# Altium schematic symbol library MCU_Microchip_ATmega.SchLib: 440 symbols (part 9 of 9) (continued)
## ATxmega192C3-M (continued)

## ATxmega192D3-A
designator *  value ATxmega192D3-A
ki_keywords: AVR 8/16bit Microcontroller XMegaAVR; ki_description: 32MHz, 192kB Flash, 8kB Boot, 16kB SRAM, 2kB EEPROM, JTAG, TQFP-64; ki_fp_filters: TQFP*14x14mm*P0.8mm*; Footprint: Package_QFP:TQFP-64_14x14mm_P0.8mm; Supplier: http://ww1.microchip.com/downloads/en/DeviceDoc/Atmel-8134-8-16-bit-Atmel-XMEGA-D3-Microcontroller_Datasheet.pdf
footprint TQFP-64_14x14mm_P0.8mm
pins: 1 PA3 (io), 2 PA4 (io), 3 PA5 (io), 4 PA6 (io), 5 PA7 (io), 6 AREFB/PB0 (io), 7 PB1 (io), 8 PB2 (io), 9 PB3 (io), 10 PB4 (io), 11 PB5 (io), 12 PB6 (io), 13 PB7 (io), 14 GND (power), 15 VCC (power), 16 PC0 (io), 17 PC1 (io), 18 PC2 (io), 19 PC3 (io), 20 PC4 (io), 21 PC5 (io), 22 PC6 (io), 23 PC7 (io), 24 GND hidden, 25 VCC hidden, 26 PD0 (io), 27 PD1 (io), 28 PD2 (io), 29 PD3 (io), 30 PD4 (io), 31 PD5 (io), 32 PD6 (io), 33 PD7 (io), 34 GND hidden, 35 VCC hidden, 36 PE0 (io), 37 PE1 (io), 38 PE2 (io), 39 PE3 (io), 40 PE4 (io), 41 PE5 (io), 42 PE6 (io), 43 PE7 (io), 44 GND hidden, 45 VCC hidden, 46 PF0 (io), 47 PF1 (io), 48 PF2 (io), 49 PF3 (io), 50 PF4 (io), 51 PF5 (io), 52 GND hidden, 53 VCC hidden, 54 PF6 (io), 55 PF7 (io), 56 PDI_DATA (io), 57 ~{{RESET}/PDI_CLK} (in), 58 PR0/XTAL2 (io), 59 PR1/XTAL1 (io), 60 GND hidden, 61 AVCC (power), 62 AREFA/PA0 (io), 63 PA1 (io), 64 PA2 (io)

## ATxmega192D3-M
designator *  value ATxmega192D3-M
ki_keywords: AVR 8/16bit Microcontroller XMegaAVR; ki_description: 32MHz, 192kB Flash, 8kB Boot, 16kB SRAM, 2kB EEPROM, JTAG, QFN-64; ki_fp_filters: QFN*1EP*9x9mm*P0.5mm*; Footprint: Package_DFN_QFN:QFN-64-1EP_9x9mm_P0.5mm_EP7.65x7.65mm; Supplier: http://ww1.microchip.com/downloads/en/DeviceDoc/Atmel-8134-8-16-bit-Atmel-XMEGA-D3-Microcontroller_Datasheet.pdf
footprint QFN-64-1EP_9x9mm_P0.5mm_EP7.65x7.65mm
pins: 1 PA3 (io), 2 PA4 (io), 3 PA5 (io), 4 PA6 (io), 5 PA7 (io), 6 AREFB/PB0 (io), 7 PB1 (io), 8 PB2 (io), 9 PB3 (io), 10 PB4 (io), 11 PB5 (io), 12 PB6 (io), 13 PB7 (io), 14 GND (power), 15 VCC (power), 16 PC0 (io), 17 PC1 (io), 18 PC2 (io), 19 PC3 (io), 20 PC4 (io), 21 PC5 (io), 22 PC6 (io), 23 PC7 (io), 24 GND hidden, 25 VCC hidden, 26 PD0 (io), 27 PD1 (io), 28 PD2 (io), 29 PD3 (io), 30 PD4 (io), 31 PD5 (io), 32 PD6 (io), 33 PD7 (io), 34 GND hidden, 35 VCC hidden, 36 PE0 (io), 37 PE1 (io), 38 PE2 (io), 39 PE3 (io), 40 PE4 (io), 41 PE5 (io), 42 PE6 (io), 43 PE7 (io), 44 GND hidden, 45 VCC hidden, 46 PF0 (io), 47 PF1 (io), 48 PF2 (io), 49 PF3 (io), 50 PF4 (io), 51 PF5 (io), 52 GND hidden, 53 VCC hidden, 54 PF6 (io), 55 PF7 (io), 56 PDI_DATA (io), 57 ~{{RESET}/PDI_CLK} (in), 58 PR0/XTAL2 (io), 59 PR1/XTAL1 (io), 60 GND hidden, 61 AVCC (power), 62 AREFA/PA0 (io), 63 PA1 (io), 64 PA2 (io), 65 GND hidden

## ATxmega256A3-A
designator *  value ATxmega256A3-A
ki_keywords: AVR 8/16bit Microcontroller XMegaAVR; ki_description: 32MHz, 256kB Flash, 8kB Boot, 16kB SRAM, 4kB EEPROM, JTAG, TQFP-64; ki_fp_filters: TQFP*14x14mm*P0.8mm*; Footprint: Package_QFP:TQFP-64_14x14mm_P0.8mm; Supplier: http://ww1.microchip.com/downloads/en/DeviceDoc/Atmel-8068-8-and16-bit-AVR-XMEGA-A3-Microcontrollers_Datasheet.pdf
footprint TQFP-64_14x14mm_P0.8mm
pins: 1 PA3 (io), 2 PA4 (io), 3 PA5 (io), 4 PA6 (io), 5 PA7 (io), 6 AREFB/PB0 (io), 7 PB1 (io), 8 PB2 (io), 9 PB3 (io), 10 PB4 (io), 11 PB5 (io), 12 PB6 (io), 13 PB7 (io), 14 GND (power), 15 VCC (power), 16 PC0 (io), 17 PC1 (io), 18 PC2 (io), 19 PC3 (io), 20 PC4 (io), 21 PC5 (io), 22 PC6 (io), 23 PC7 (io), 24 GND hidden, 25 VCC hidden, 26 PD0 (io), 27 PD1 (io), 28 PD2 (io), 29 PD3 (io), 30 PD4 (io), 31 PD5 (io), 32 PD6 (io), 33 PD7 (io), 34 GND hidden, 35 VCC hidden, 36 PE0 (io), 37 PE1 (io), 38 PE2 (io), 39 PE3 (io), 40 PE4 (io), 41 PE5 (io), 42 PE6 (io), 43 PE7 (io), 44 GND hidden, 45 VCC hidden, 46 PF0 (io), 47 PF1 (io), 48 PF2 (io), 49 PF3 (io), 50 PF4 (io), 51 PF5 (io), 52 GND hidden, 53 VCC hidden, 54 PF6 (io), 55 PF7 (io), 56 PDI_DATA (io), 57 ~{{RESET}/PDI_CLK} (in), 58 PR0/XTAL2 (io), 59 PR1/XTAL1 (io), 60 GND hidden, 61 AVCC (power), 62 AREFA/PA0 (io), 63 PA1 (io), 64 PA2 (io)

## ATxmega256A3-M
designator *  value ATxmega256A3-M
ki_keywords: AVR 8/16bit Microcontroller XMegaAVR; ki_description: 32MHz, 256kB Flash, 8kB Boot, 16kB SRAM, 4kB EEPROM, JTAG, QFN-64; ki_fp_filters: QFN*1EP*9x9mm*P0.5mm*; Footprint: Package_DFN_QFN:QFN-64-1EP_9x9mm_P0.5mm_EP7.65x7.65mm; Supplier: http://ww1.microchip.com/downloads/en/DeviceDoc/Atmel-8068-8-and16-bit-AVR-XMEGA-A3-Microcontrollers_Datasheet.pdf
footprint QFN-64-1EP_9x9mm_P0.5mm_EP7.65x7.65mm
pins: 1 PA3 (io), 2 PA4 (io), 3 PA5 (io), 4 PA6 (io), 5 PA7 (io), 6 AREFB/PB0 (io), 7 PB1 (io), 8 PB2 (io), 9 PB3 (io), 10 PB4 (io), 11 PB5 (io), 12 PB6 (io), 13 PB7 (io), 14 GND (power), 15 VCC (power), 16 PC0 (io), 17 PC1 (io), 18 PC2 (io), 19 PC3 (io), 20 PC4 (io), 21 PC5 (io), 22 PC6 (io), 23 PC7 (io), 24 GND hidden, 25 VCC hidden, 26 PD0 (io), 27 PD1 (io), 28 PD2 (io), 29 PD3 (io), 30 PD4 (io), 31 PD5 (io), 32 PD6 (io), 33 PD7 (io), 34 GND hidden, 35 VCC hidden, 36 PE0 (io), 37 PE1 (io), 38 PE2 (io), 39 PE3 (io), 40 PE4 (io), 41 PE5 (io), 42 PE6 (io), 43 PE7 (io), 44 GND hidden, 45 VCC hidden, 46 PF0 (io), 47 PF1 (io), 48 PF2 (io), 49 PF3 (io), 50 PF4 (io), 51 PF5 (io), 52 GND hidden, 53 VCC hidden, 54 PF6 (io), 55 PF7 (io), 56 PDI_DATA (io), 57 ~{{RESET}/PDI_CLK} (in), 58 PR0/XTAL2 (io), 59 PR1/XTAL1 (io), 60 GND hidden, 61 AVCC (power), 62 AREFA/PA0 (io), 63 PA1 (io), 64 PA2 (io), 65 GND hidden

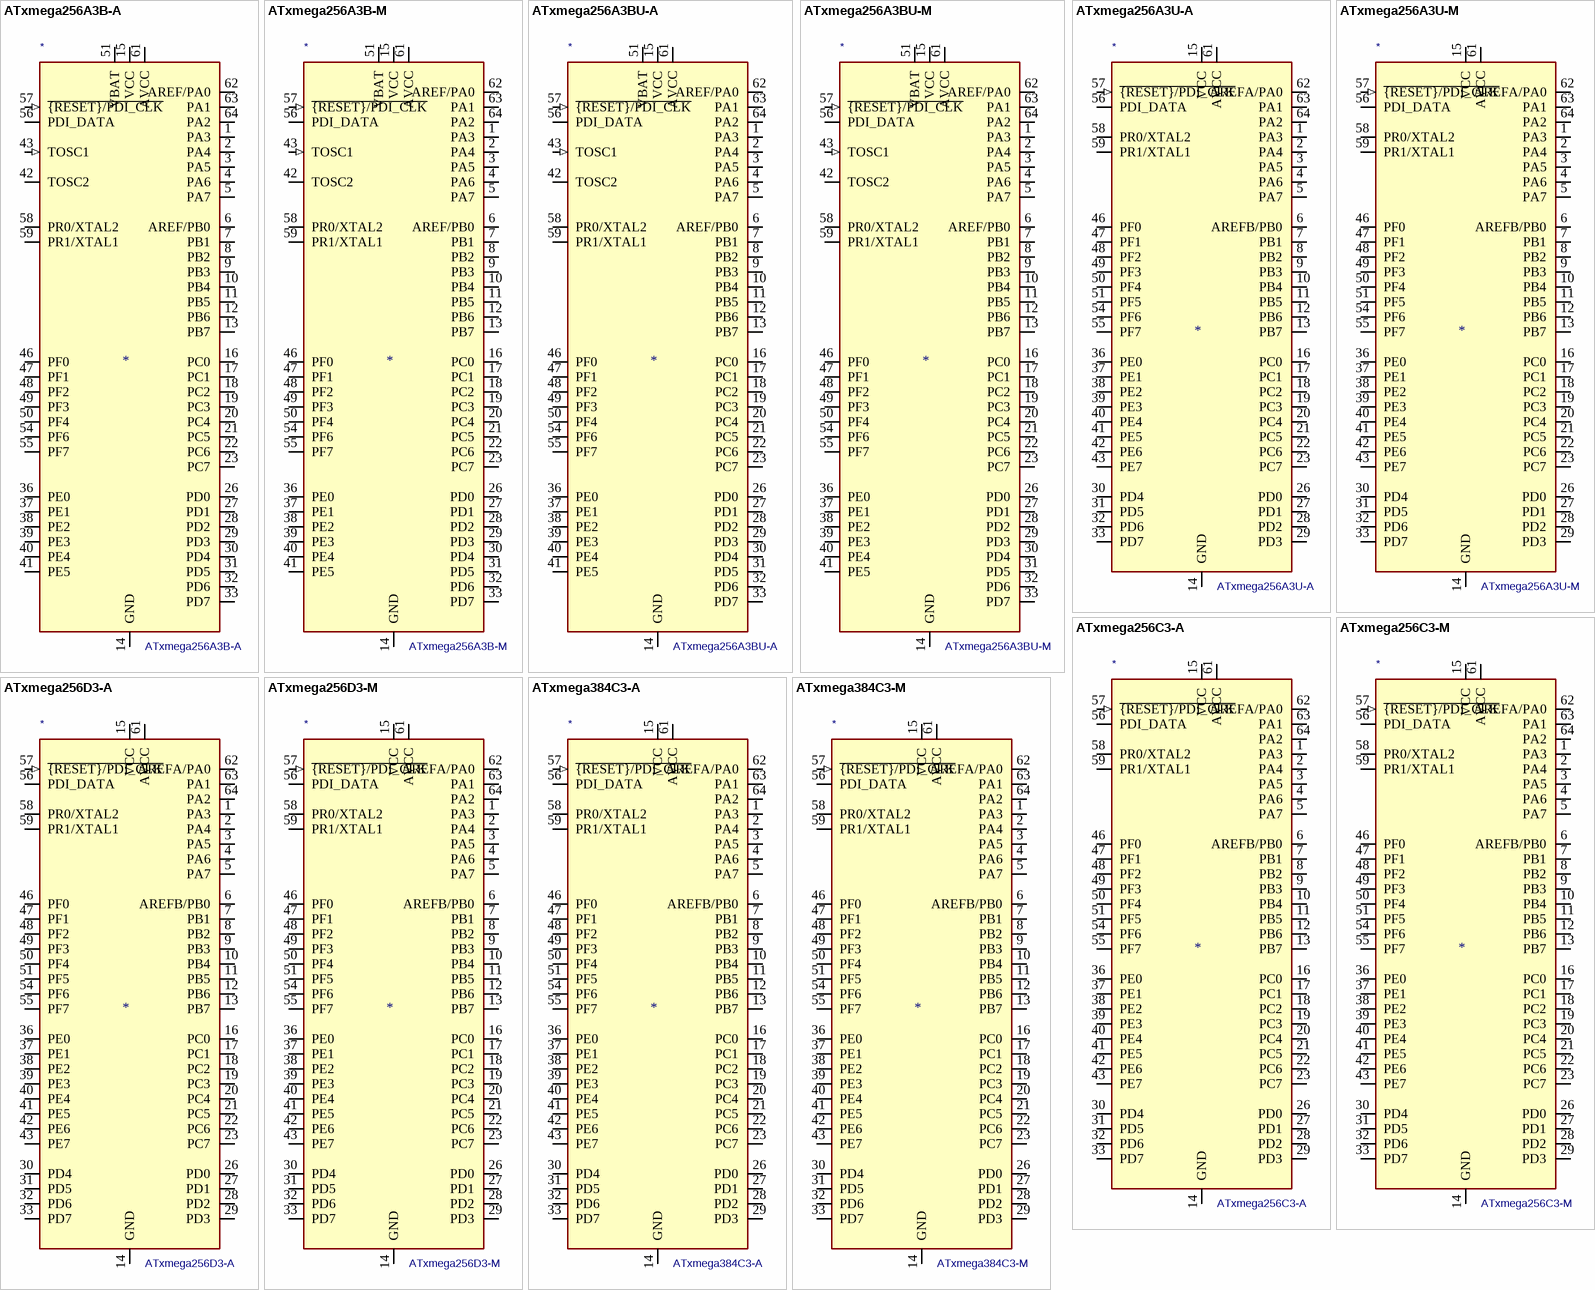
[diagram p39: symbols ATxmega256A3B-A to ATxmega384C3-M]

## ATxmega256A3B-A
designator *  value ATxmega256A3B-A
ki_keywords: AVR 8/16bit Microcontroller XMegaAVR; ki_description: 32MHz, 256kB Flash, 8kB Boot, 16kB SRAM, 4kB EEPROM, JTAG, TQFP-64; ki_fp_filters: TQFP*14x14mm*P0.8mm*; Footprint: Package_QFP:TQFP-64_14x14mm_P0.8mm; Supplier: http://ww1.microchip.com/downloads/en/DeviceDoc/Atmel-8116-8-and-16-bit-AVR-XMEGA-A3B-Microcontroller_Datasheet.pdf
footprint TQFP-64_14x14mm_P0.8mm
pins: 1 PA3 (io), 2 PA4 (io), 3 PA5 (io), 4 PA6 (io), 5 PA7 (io), 6 AREF/PB0 (io), 7 PB1 (io), 8 PB2 (io), 9 PB3 (io), 10 PB4 (io), 11 PB5 (io), 12 PB6 (io), 13 PB7 (io), 14 GND (power), 15 VCC (power), 16 PC0 (io), 17 PC1 (io), 18 PC2 (io), 19 PC3 (io), 20 PC4 (io), 21 PC5 (io), 22 PC6 (io), 23 PC7 (io), 24 GND hidden, 25 VCC hidden, 26 PD0 (io), 27 PD1 (io), 28 PD2 (io), 29 PD3 (io), 30 PD4 (io), 31 PD5 (io), 32 PD6 (io), 33 PD7 (io), 34 GND hidden, 35 VCC hidden, 36 PE0 (io), 37 PE1 (io), 38 PE2 (io), 39 PE3 (io), 40 PE4 (io), 41 PE5 (io), 42 TOSC2, 43 TOSC1 (in), 44 GND hidden, 45 VCC hidden, 46 PF0 (io), 47 PF1 (io), 48 PF2 (io), 49 PF3 (io), 50 PF4 (io), 51 VBAT (power), 52 GND hidden, 53 VCC hidden, 54 PF6 (io), 55 PF7 (io), 56 PDI_DATA (io), 57 ~{{RESET}/PDI_CLK} (in), 58 PR0/XTAL2 (io), 59 PR1/XTAL1 (io), 60 GND hidden, 61 AVCC (power), 62 AREF/PA0 (io), 63 PA1 (io), 64 PA2 (io)

## ATxmega256A3B-M
designator *  value ATxmega256A3B-M
ki_keywords: AVR 8/16bit Microcontroller XMegaAVR; ki_description: 32MHz, 256kB Flash, 8kB Boot, 16kB SRAM, 4kB EEPROM, JTAG, QFN-64; ki_fp_filters: QFN*1EP*9x9mm*P0.5mm*; Footprint: Package_DFN_QFN:QFN-64-1EP_9x9mm_P0.5mm_EP7.65x7.65mm; Supplier: http://ww1.microchip.com/downloads/en/DeviceDoc/Atmel-8116-8-and-16-bit-AVR-XMEGA-A3B-Microcontroller_Datasheet.pdf
footprint QFN-64-1EP_9x9mm_P0.5mm_EP7.65x7.65mm
pins: 1 PA3 (io), 2 PA4 (io), 3 PA5 (io), 4 PA6 (io), 5 PA7 (io), 6 AREF/PB0 (io), 7 PB1 (io), 8 PB2 (io), 9 PB3 (io), 10 PB4 (io), 11 PB5 (io), 12 PB6 (io), 13 PB7 (io), 14 GND (power), 15 VCC (power), 16 PC0 (io), 17 PC1 (io), 18 PC2 (io), 19 PC3 (io), 20 PC4 (io), 21 PC5 (io), 22 PC6 (io), 23 PC7 (io), 24 GND hidden, 25 VCC hidden, 26 PD0 (io), 27 PD1 (io), 28 PD2 (io), 29 PD3 (io), 30 PD4 (io), 31 PD5 (io), 32 PD6 (io), 33 PD7 (io), 34 GND hidden, 35 VCC hidden, 36 PE0 (io), 37 PE1 (io), 38 PE2 (io), 39 PE3 (io), 40 PE4 (io), 41 PE5 (io), 42 TOSC2, 43 TOSC1 (in), 44 GND hidden, 45 VCC hidden, 46 PF0 (io), 47 PF1 (io), 48 PF2 (io), 49 PF3 (io), 50 PF4 (io), 51 VBAT (power), 52 GND hidden, 53 VCC hidden, 54 PF6 (io), 55 PF7 (io), 56 PDI_DATA (io), 57 ~{{RESET}/PDI_CLK} (in), 58 PR0/XTAL2 (io), 59 PR1/XTAL1 (io), 60 GND hidden, 61 AVCC (power), 62 AREF/PA0 (io), 63 PA1 (io), 64 PA2 (io), 65 GND hidden

## ATxmega256A3BU-A
designator *  value ATxmega256A3BU-A
ki_keywords: AVR 8/16bit Microcontroller XMegaAVR; ki_description: 32MHz, 256kB Flash, 8kB Boot, 16kB SRAM, 4kB EEPROM, JTAG, USB, TQFP-64; ki_fp_filters: TQFP*14x14mm*P0.8mm*; Footprint: Package_QFP:TQFP-64_14x14mm_P0.8mm; Supplier: http://ww1.microchip.com/downloads/en/DeviceDoc/Atmel-8362-8-and-16bit-AVR-microcontroller-ATxmega256A3BU_datasheet.pdf
footprint TQFP-64_14x14mm_P0.8mm
pins: 1 PA3 (io), 2 PA4 (io), 3 PA5 (io), 4 PA6 (io), 5 PA7 (io), 6 AREF/PB0 (io), 7 PB1 (io), 8 PB2 (io), 9 PB3 (io), 10 PB4 (io), 11 PB5 (io), 12 PB6 (io), 13 PB7 (io), 14 GND (power), 15 VCC (power), 16 PC0 (io), 17 PC1 (io), 18 PC2 (io), 19 PC3 (io), 20 PC4 (io), 21 PC5 (io), 22 PC6 (io), 23 PC7 (io), 24 GND hidden, 25 VCC hidden, 26 PD0 (io), 27 PD1 (io), 28 PD2 (io), 29 PD3 (io), 30 PD4 (io), 31 PD5 (io), 32 PD6 (io), 33 PD7 (io), 34 GND hidden, 35 VCC hidden, 36 PE0 (io), 37 PE1 (io), 38 PE2 (io), 39 PE3 (io), 40 PE4 (io), 41 PE5 (io), 42 TOSC2, 43 TOSC1 (in), 44 GND hidden, 45 VCC hidden, 46 PF0 (io), 47 PF1 (io), 48 PF2 (io), 49 PF3 (io), 50 PF4 (io), 51 VBAT (power), 52 GND hidden, 53 VCC hidden, 54 PF6 (io), 55 PF7 (io), 56 PDI_DATA (io), 57 ~{{RESET}/PDI_CLK} (in), 58 PR0/XTAL2 (io), 59 PR1/XTAL1 (io), 60 GND hidden, 61 AVCC (power), 62 AREF/PA0 (io), 63 PA1 (io), 64 PA2 (io)

## ATxmega256A3BU-M
designator *  value ATxmega256A3BU-M
ki_keywords: AVR 8/16bit Microcontroller XMegaAVR; ki_description: 32MHz, 256kB Flash, 8kB Boot, 16kB SRAM, 4kB EEPROM, JTAG, USB, QFN-64; ki_fp_filters: QFN*1EP*9x9mm*P0.5mm*; Footprint: Package_DFN_QFN:QFN-64-1EP_9x9mm_P0.5mm_EP7.65x7.65mm; Supplier: http://ww1.microchip.com/downloads/en/DeviceDoc/Atmel-8362-8-and-16bit-AVR-microcontroller-ATxmega256A3BU_datasheet.pdf
footprint QFN-64-1EP_9x9mm_P0.5mm_EP7.65x7.65mm
pins: 1 PA3 (io), 2 PA4 (io), 3 PA5 (io), 4 PA6 (io), 5 PA7 (io), 6 AREF/PB0 (io), 7 PB1 (io), 8 PB2 (io), 9 PB3 (io), 10 PB4 (io), 11 PB5 (io), 12 PB6 (io), 13 PB7 (io), 14 GND (power), 15 VCC (power), 16 PC0 (io), 17 PC1 (io), 18 PC2 (io), 19 PC3 (io), 20 PC4 (io), 21 PC5 (io), 22 PC6 (io), 23 PC7 (io), 24 GND hidden, 25 VCC hidden, 26 PD0 (io), 27 PD1 (io), 28 PD2 (io), 29 PD3 (io), 30 PD4 (io), 31 PD5 (io), 32 PD6 (io), 33 PD7 (io), 34 GND hidden, 35 VCC hidden, 36 PE0 (io), 37 PE1 (io), 38 PE2 (io), 39 PE3 (io), 40 PE4 (io), 41 PE5 (io), 42 TOSC2, 43 TOSC1 (in), 44 GND hidden, 45 VCC hidden, 46 PF0 (io), 47 PF1 (io), 48 PF2 (io), 49 PF3 (io), 50 PF4 (io), 51 VBAT (power), 52 GND hidden, 53 VCC hidden, 54 PF6 (io), 55 PF7 (io), 56 PDI_DATA (io), 57 ~{{RESET}/PDI_CLK} (in), 58 PR0/XTAL2 (io), 59 PR1/XTAL1 (io), 60 GND hidden, 61 AVCC (power), 62 AREF/PA0 (io), 63 PA1 (io), 64 PA2 (io), 65 GND hidden

## ATxmega256A3U-A
designator *  value ATxmega256A3U-A
ki_keywords: AVR 8/16bit Microcontroller XMegaAVR; ki_description: 32MHz, 256kB Flash, 8kB Boot, 16kB SRAM, 4kB EEPROM, JTAG, USB, TQFP-64; ki_fp_filters: TQFP*14x14mm*P0.8mm*; Footprint: Package_QFP:TQFP-64_14x14mm_P0.8mm; Supplier: http://ww1.microchip.com/downloads/en/DeviceDoc/Atmel-8386-8-and-16-bit-AVR-Microcontroller-ATxmega64A3U-128A3U-192A3U-256A3U_datasheet.pdf
footprint TQFP-64_14x14mm_P0.8mm
pins: 1 PA3 (io), 2 PA4 (io), 3 PA5 (io), 4 PA6 (io), 5 PA7 (io), 6 AREFB/PB0 (io), 7 PB1 (io), 8 PB2 (io), 9 PB3 (io), 10 PB4 (io), 11 PB5 (io), 12 PB6 (io), 13 PB7 (io), 14 GND (power), 15 VCC (power), 16 PC0 (io), 17 PC1 (io), 18 PC2 (io), 19 PC3 (io), 20 PC4 (io), 21 PC5 (io), 22 PC6 (io), 23 PC7 (io), 24 GND hidden, 25 VCC hidden, 26 PD0 (io), 27 PD1 (io), 28 PD2 (io), 29 PD3 (io), 30 PD4 (io), 31 PD5 (io), 32 PD6 (io), 33 PD7 (io), 34 GND hidden, 35 VCC hidden, 36 PE0 (io), 37 PE1 (io), 38 PE2 (io), 39 PE3 (io), 40 PE4 (io), 41 PE5 (io), 42 PE6 (io), 43 PE7 (io), 44 GND hidden, 45 VCC hidden, 46 PF0 (io), 47 PF1 (io), 48 PF2 (io), 49 PF3 (io), 50 PF4 (io), 51 PF5 (io), 52 GND hidden, 53 VCC hidden, 54 PF6 (io), 55 PF7 (io), 56 PDI_DATA (io), 57 ~{{RESET}/PDI_CLK} (in), 58 PR0/XTAL2 (io), 59 PR1/XTAL1 (io), 60 GND hidden, 61 AVCC (power), 62 AREFA/PA0 (io), 63 PA1 (io), 64 PA2 (io)

## ATxmega256A3U-M
designator *  value ATxmega256A3U-M
ki_keywords: AVR 8/16bit Microcontroller XMegaAVR; ki_description: 32MHz, 256kB Flash, 8kB Boot, 16kB SRAM, 4kB EEPROM, JTAG, USB, QFN-64; ki_fp_filters: QFN*1EP*9x9mm*P0.5mm*; Footprint: Package_DFN_QFN:QFN-64-1EP_9x9mm_P0.5mm_EP7.65x7.65mm; Supplier: http://ww1.microchip.com/downloads/en/DeviceDoc/Atmel-8386-8-and-16-bit-AVR-Microcontroller-ATxmega64A3U-128A3U-192A3U-256A3U_datasheet.pdf
footprint QFN-64-1EP_9x9mm_P0.5mm_EP7.65x7.65mm
pins: 1 PA3 (io), 2 PA4 (io), 3 PA5 (io), 4 PA6 (io), 5 PA7 (io), 6 AREFB/PB0 (io), 7 PB1 (io), 8 PB2 (io), 9 PB3 (io), 10 PB4 (io), 11 PB5 (io), 12 PB6 (io), 13 PB7 (io), 14 GND (power), 15 VCC (power), 16 PC0 (io), 17 PC1 (io), 18 PC2 (io), 19 PC3 (io), 20 PC4 (io), 21 PC5 (io), 22 PC6 (io), 23 PC7 (io), 24 GND hidden, 25 VCC hidden, 26 PD0 (io), 27 PD1 (io), 28 PD2 (io), 29 PD3 (io), 30 PD4 (io), 31 PD5 (io), 32 PD6 (io), 33 PD7 (io), 34 GND hidden, 35 VCC hidden, 36 PE0 (io), 37 PE1 (io), 38 PE2 (io), 39 PE3 (io), 40 PE4 (io), 41 PE5 (io), 42 PE6 (io), 43 PE7 (io), 44 GND hidden, 45 VCC hidden, 46 PF0 (io), 47 PF1 (io), 48 PF2 (io), 49 PF3 (io), 50 PF4 (io), 51 PF5 (io), 52 GND hidden, 53 VCC hidden, 54 PF6 (io), 55 PF7 (io), 56 PDI_DATA (io), 57 ~{{RESET}/PDI_CLK} (in), 58 PR0/XTAL2 (io), 59 PR1/XTAL1 (io), 60 GND hidden, 61 AVCC (power), 62 AREFA/PA0 (io), 63 PA1 (io), 64 PA2 (io), 65 GND hidden

## ATxmega256C3-A
designator *  value ATxmega256C3-A
ki_keywords: AVR 8/16bit Microcontroller XMegaAVR; ki_description: 32MHz, 256kB Flash, 8kB Boot, 16kB SRAM, 4kB EEPROM, JTAG, USB, TQFP-64; ki_fp_filters: TQFP*14x14mm*P0.8mm*; Footprint: Package_QFP:TQFP-64_14x14mm_P0.8mm; Supplier: http://ww1.microchip.com/downloads/en/DeviceDoc/Atmel-8492-8-and-16-bit-AVR-microcontroller-ATxmega32C3_64C3_128C3_192C3_256C3_datasheet.pdf
footprint TQFP-64_14x14mm_P0.8mm
pins: 1 PA3 (io), 2 PA4 (io), 3 PA5 (io), 4 PA6 (io), 5 PA7 (io), 6 AREFB/PB0 (io), 7 PB1 (io), 8 PB2 (io), 9 PB3 (io), 10 PB4 (io), 11 PB5 (io), 12 PB6 (io), 13 PB7 (io), 14 GND (power), 15 VCC (power), 16 PC0 (io), 17 PC1 (io), 18 PC2 (io), 19 PC3 (io), 20 PC4 (io), 21 PC5 (io), 22 PC6 (io), 23 PC7 (io), 24 GND hidden, 25 VCC hidden, 26 PD0 (io), 27 PD1 (io), 28 PD2 (io), 29 PD3 (io), 30 PD4 (io), 31 PD5 (io), 32 PD6 (io), 33 PD7 (io), 34 GND hidden, 35 VCC hidden, 36 PE0 (io), 37 PE1 (io), 38 PE2 (io), 39 PE3 (io), 40 PE4 (io), 41 PE5 (io), 42 PE6 (io), 43 PE7 (io), 44 GND hidden, 45 VCC hidden, 46 PF0 (io), 47 PF1 (io), 48 PF2 (io), 49 PF3 (io), 50 PF4 (io), 51 PF5 (io), 52 GND hidden, 53 VCC hidden, 54 PF6 (io), 55 PF7 (io), 56 PDI_DATA (io), 57 ~{{RESET}/PDI_CLK} (in), 58 PR0/XTAL2 (io), 59 PR1/XTAL1 (io), 60 GND hidden, 61 AVCC (power), 62 AREFA/PA0 (io), 63 PA1 (io), 64 PA2 (io)

## ATxmega256C3-M
designator *  value ATxmega256C3-M
ki_keywords: AVR 8/16bit Microcontroller XMegaAVR; ki_description: 32MHz, 256kB Flash, 8kB Boot, 16kB SRAM, 4kB EEPROM, JTAG, USB, QFN-64; ki_fp_filters: QFN*1EP*9x9mm*P0.5mm*; Footprint: Package_DFN_QFN:QFN-64-1EP_9x9mm_P0.5mm_EP7.65x7.65mm; Supplier: http://ww1.microchip.com/downloads/en/DeviceDoc/Atmel-8492-8-and-16-bit-AVR-microcontroller-ATxmega32C3_64C3_128C3_192C3_256C3_datasheet.pdf
footprint QFN-64-1EP_9x9mm_P0.5mm_EP7.65x7.65mm
pins: 1 PA3 (io), 2 PA4 (io), 3 PA5 (io), 4 PA6 (io), 5 PA7 (io), 6 AREFB/PB0 (io), 7 PB1 (io), 8 PB2 (io), 9 PB3 (io), 10 PB4 (io), 11 PB5 (io), 12 PB6 (io), 13 PB7 (io), 14 GND (power), 15 VCC (power), 16 PC0 (io), 17 PC1 (io), 18 PC2 (io), 19 PC3 (io), 20 PC4 (io), 21 PC5 (io), 22 PC6 (io), 23 PC7 (io), 24 GND hidden, 25 VCC hidden, 26 PD0 (io), 27 PD1 (io), 28 PD2 (io), 29 PD3 (io), 30 PD4 (io), 31 PD5 (io), 32 PD6 (io), 33 PD7 (io), 34 GND hidden, 35 VCC hidden, 36 PE0 (io), 37 PE1 (io), 38 PE2 (io), 39 PE3 (io), 40 PE4 (io), 41 PE5 (io), 42 PE6 (io), 43 PE7 (io), 44 GND hidden, 45 VCC hidden, 46 PF0 (io), 47 PF1 (io), 48 PF2 (io), 49 PF3 (io), 50 PF4 (io), 51 PF5 (io), 52 GND hidden, 53 VCC hidden, 54 PF6 (io), 55 PF7 (io), 56 PDI_DATA (io), 57 ~{{RESET}/PDI_CLK} (in), 58 PR0/XTAL2 (io), 59 PR1/XTAL1 (io), 60 GND hidden, 61 AVCC (power), 62 AREFA/PA0 (io), 63 PA1 (io), 64 PA2 (io), 65 GND hidden

## ATxmega256D3-A
designator *  value ATxmega256D3-A
ki_keywords: AVR 8/16bit Microcontroller XMegaAVR; ki_description: 32MHz, 256kB Flash, 8kB Boot, 16kB SRAM, 4kB EEPROM, JTAG, TQFP-64; ki_fp_filters: TQFP*14x14mm*P0.8mm*; Footprint: Package_QFP:TQFP-64_14x14mm_P0.8mm; Supplier: http://ww1.microchip.com/downloads/en/DeviceDoc/Atmel-8134-8-16-bit-Atmel-XMEGA-D3-Microcontroller_Datasheet.pdf
footprint TQFP-64_14x14mm_P0.8mm
pins: 1 PA3 (io), 2 PA4 (io), 3 PA5 (io), 4 PA6 (io), 5 PA7 (io), 6 AREFB/PB0 (io), 7 PB1 (io), 8 PB2 (io), 9 PB3 (io), 10 PB4 (io), 11 PB5 (io), 12 PB6 (io), 13 PB7 (io), 14 GND (power), 15 VCC (power), 16 PC0 (io), 17 PC1 (io), 18 PC2 (io), 19 PC3 (io), 20 PC4 (io), 21 PC5 (io), 22 PC6 (io), 23 PC7 (io), 24 GND hidden, 25 VCC hidden, 26 PD0 (io), 27 PD1 (io), 28 PD2 (io), 29 PD3 (io), 30 PD4 (io), 31 PD5 (io), 32 PD6 (io), 33 PD7 (io), 34 GND hidden, 35 VCC hidden, 36 PE0 (io), 37 PE1 (io), 38 PE2 (io), 39 PE3 (io), 40 PE4 (io), 41 PE5 (io), 42 PE6 (io), 43 PE7 (io), 44 GND hidden, 45 VCC hidden, 46 PF0 (io), 47 PF1 (io), 48 PF2 (io), 49 PF3 (io), 50 PF4 (io), 51 PF5 (io), 52 GND hidden, 53 VCC hidden, 54 PF6 (io), 55 PF7 (io), 56 PDI_DATA (io), 57 ~{{RESET}/PDI_CLK} (in), 58 PR0/XTAL2 (io), 59 PR1/XTAL1 (io), 60 GND hidden, 61 AVCC (power), 62 AREFA/PA0 (io), 63 PA1 (io), 64 PA2 (io)

## ATxmega256D3-M
designator *  value ATxmega256D3-M
ki_keywords: AVR 8/16bit Microcontroller XMegaAVR; ki_description: 32MHz, 256kB Flash, 8kB Boot, 16kB SRAM, 4kB EEPROM, JTAG, QFN-64; ki_fp_filters: QFN*1EP*9x9mm*P0.5mm*; Footprint: Package_DFN_QFN:QFN-64-1EP_9x9mm_P0.5mm_EP7.65x7.65mm; Supplier: http://ww1.microchip.com/downloads/en/DeviceDoc/Atmel-8134-8-16-bit-Atmel-XMEGA-D3-Microcontroller_Datasheet.pdf
footprint QFN-64-1EP_9x9mm_P0.5mm_EP7.65x7.65mm
pins: 1 PA3 (io), 2 PA4 (io), 3 PA5 (io), 4 PA6 (io), 5 PA7 (io), 6 AREFB/PB0 (io), 7 PB1 (io), 8 PB2 (io), 9 PB3 (io), 10 PB4 (io), 11 PB5 (io), 12 PB6 (io), 13 PB7 (io), 14 GND (power), 15 VCC (power), 16 PC0 (io), 17 PC1 (io), 18 PC2 (io), 19 PC3 (io), 20 PC4 (io), 21 PC5 (io), 22 PC6 (io), 23 PC7 (io), 24 GND hidden, 25 VCC hidden, 26 PD0 (io), 27 PD1 (io), 28 PD2 (io), 29 PD3 (io), 30 PD4 (io), 31 PD5 (io), 32 PD6 (io), 33 PD7 (io), 34 GND hidden, 35 VCC hidden, 36 PE0 (io), 37 PE1 (io), 38 PE2 (io), 39 PE3 (io), 40 PE4 (io), 41 PE5 (io), 42 PE6 (io), 43 PE7 (io), 44 GND hidden, 45 VCC hidden, 46 PF0 (io), 47 PF1 (io), 48 PF2 (io), 49 PF3 (io), 50 PF4 (io), 51 PF5 (io), 52 GND hidden, 53 VCC hidden, 54 PF6 (io), 55 PF7 (io), 56 PDI_DATA (io), 57 ~{{RESET}/PDI_CLK} (in), 58 PR0/XTAL2 (io), 59 PR1/XTAL1 (io), 60 GND hidden, 61 AVCC (power), 62 AREFA/PA0 (io), 63 PA1 (io), 64 PA2 (io), 65 GND hidden

## ATxmega384C3-A
designator *  value ATxmega384C3-A
ki_keywords: AVR 8/16bit Microcontroller XMegaAVR; ki_description: 32MHz, 384kB Flash, 8kB Boot, 32kB SRAM, 4kB EEPROM, JTAG, USB, TQFP-64; ki_fp_filters: TQFP*14x14mm*P0.8mm*; Footprint: Package_QFP:TQFP-64_14x14mm_P0.8mm; Supplier: http://ww1.microchip.com/downloads/en/DeviceDoc/Atmel-8361-8-and-16-bit-AVR-XMEGA-Microcontrollers-ATxmega384C3_Datasheet.pdf
footprint TQFP-64_14x14mm_P0.8mm
pins: 1 PA3 (io), 2 PA4 (io), 3 PA5 (io), 4 PA6 (io), 5 PA7 (io), 6 AREFB/PB0 (io), 7 PB1 (io), 8 PB2 (io), 9 PB3 (io), 10 PB4 (io), 11 PB5 (io), 12 PB6 (io), 13 PB7 (io), 14 GND (power), 15 VCC (power), 16 PC0 (io), 17 PC1 (io), 18 PC2 (io), 19 PC3 (io), 20 PC4 (io), 21 PC5 (io), 22 PC6 (io), 23 PC7 (io), 24 GND hidden, 25 VCC hidden, 26 PD0 (io), 27 PD1 (io), 28 PD2 (io), 29 PD3 (io), 30 PD4 (io), 31 PD5 (io), 32 PD6 (io), 33 PD7 (io), 34 GND hidden, 35 VCC hidden, 36 PE0 (io), 37 PE1 (io), 38 PE2 (io), 39 PE3 (io), 40 PE4 (io), 41 PE5 (io), 42 PE6 (io), 43 PE7 (io), 44 GND hidden, 45 VCC hidden, 46 PF0 (io), 47 PF1 (io), 48 PF2 (io), 49 PF3 (io), 50 PF4 (io), 51 PF5 (io), 52 GND hidden, 53 VCC hidden, 54 PF6 (io), 55 PF7 (io), 56 PDI_DATA (io), 57 ~{{RESET}/PDI_CLK} (in), 58 PR0/XTAL2 (io), 59 PR1/XTAL1 (io), 60 GND hidden, 61 AVCC (power), 62 AREFA/PA0 (io), 63 PA1 (io), 64 PA2 (io)

## ATxmega384C3-M
designator *  value ATxmega384C3-M
ki_keywords: AVR 8/16bit Microcontroller XMegaAVR; ki_description: 32MHz, 384kB Flash, 8kB Boot, 32kB SRAM, 4kB EEPROM, JTAG, USB, QFN-64; ki_fp_filters: QFN*1EP*9x9mm*P0.5mm*; Footprint: Package_DFN_QFN:QFN-64-1EP_9x9mm_P0.5mm_EP7.65x7.65mm; Supplier: http://ww1.microchip.com/downloads/en/DeviceDoc/Atmel-8361-8-and-16-bit-AVR-XMEGA-Microcontrollers-ATxmega384C3_Datasheet.pdf
footprint QFN-64-1EP_9x9mm_P0.5mm_EP7.65x7.65mm
pins: 1 PA3 (io), 2 PA4 (io), 3 PA5 (io), 4 PA6 (io), 5 PA7 (io), 6 AREFB/PB0 (io), 7 PB1 (io), 8 PB2 (io), 9 PB3 (io), 10 PB4 (io), 11 PB5 (io), 12 PB6 (io), 13 PB7 (io), 14 GND (power), 15 VCC (power), 16 PC0 (io), 17 PC1 (io), 18 PC2 (io), 19 PC3 (io), 20 PC4 (io), 21 PC5 (io), 22 PC6 (io), 23 PC7 (io), 24 GND hidden, 25 VCC hidden, 26 PD0 (io), 27 PD1 (io), 28 PD2 (io), 29 PD3 (io), 30 PD4 (io), 31 PD5 (io), 32 PD6 (io), 33 PD7 (io), 34 GND hidden, 35 VCC hidden, 36 PE0 (io), 37 PE1 (io), 38 PE2 (io), 39 PE3 (io), 40 PE4 (io), 41 PE5 (io), 42 PE6 (io), 43 PE7 (io), 44 GND hidden, 45 VCC hidden, 46 PF0 (io), 47 PF1 (io), 48 PF2 (io), 49 PF3 (io), 50 PF4 (io), 51 PF5 (io), 52 GND hidden, 53 VCC hidden, 54 PF6 (io), 55 PF7 (io), 56 PDI_DATA (io), 57 ~{{RESET}/PDI_CLK} (in), 58 PR0/XTAL2 (io), 59 PR1/XTAL1 (io), 60 GND hidden, 61 AVCC (power), 62 AREFA/PA0 (io), 63 PA1 (io), 64 PA2 (io), 65 GND hidden

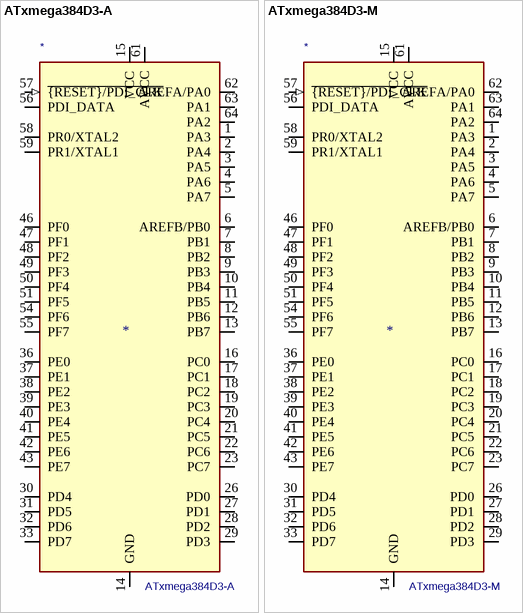
[diagram p40: symbols ATxmega384D3-A to ATxmega384D3-M]

## ATxmega384D3-A
designator *  value ATxmega384D3-A
ki_keywords: AVR 8/16bit Microcontroller XMegaAVR; ki_description: 32MHz, 384kB Flash, 8kB Boot, 32kB SRAM, 4kB EEPROM, JTAG, TQFP-64; ki_fp_filters: TQFP*14x14mm*P0.8mm*; Footprint: Package_QFP:TQFP-64_14x14mm_P0.8mm; Supplier: http://ww1.microchip.com/downloads/en/DeviceDoc/Atmel-8134-8-16-bit-Atmel-XMEGA-D3-Microcontroller_Datasheet.pdf
footprint TQFP-64_14x14mm_P0.8mm
pins: 1 PA3 (io), 2 PA4 (io), 3 PA5 (io), 4 PA6 (io), 5 PA7 (io), 6 AREFB/PB0 (io), 7 PB1 (io), 8 PB2 (io), 9 PB3 (io), 10 PB4 (io), 11 PB5 (io), 12 PB6 (io), 13 PB7 (io), 14 GND (power), 15 VCC (power), 16 PC0 (io), 17 PC1 (io), 18 PC2 (io), 19 PC3 (io), 20 PC4 (io), 21 PC5 (io), 22 PC6 (io), 23 PC7 (io), 24 GND hidden, 25 VCC hidden, 26 PD0 (io), 27 PD1 (io), 28 PD2 (io), 29 PD3 (io), 30 PD4 (io), 31 PD5 (io), 32 PD6 (io), 33 PD7 (io), 34 GND hidden, 35 VCC hidden, 36 PE0 (io), 37 PE1 (io), 38 PE2 (io), 39 PE3 (io), 40 PE4 (io), 41 PE5 (io), 42 PE6 (io), 43 PE7 (io), 44 GND hidden, 45 VCC hidden, 46 PF0 (io), 47 PF1 (io), 48 PF2 (io), 49 PF3 (io), 50 PF4 (io), 51 PF5 (io), 52 GND hidden, 53 VCC hidden, 54 PF6 (io), 55 PF7 (io), 56 PDI_DATA (io), 57 ~{{RESET}/PDI_CLK} (in), 58 PR0/XTAL2 (io), 59 PR1/XTAL1 (io), 60 GND hidden, 61 AVCC (power), 62 AREFA/PA0 (io), 63 PA1 (io), 64 PA2 (io)

## ATxmega384D3-M
designator *  value ATxmega384D3-M
ki_keywords: AVR 8/16bit Microcontroller XMegaAVR; ki_description: 32MHz, 384kB Flash, 8kB Boot, 32kB SRAM, 4kB EEPROM, JTAG, QFN-64; ki_fp_filters: QFN*1EP*9x9mm*P0.5mm*; Footprint: Package_DFN_QFN:QFN-64-1EP_9x9mm_P0.5mm_EP7.65x7.65mm; Supplier: http://ww1.microchip.com/downloads/en/DeviceDoc/Atmel-8134-8-16-bit-Atmel-XMEGA-D3-Microcontroller_Datasheet.pdf
footprint QFN-64-1EP_9x9mm_P0.5mm_EP7.65x7.65mm
pins: 1 PA3 (io), 2 PA4 (io), 3 PA5 (io), 4 PA6 (io), 5 PA7 (io), 6 AREFB/PB0 (io), 7 PB1 (io), 8 PB2 (io), 9 PB3 (io), 10 PB4 (io), 11 PB5 (io), 12 PB6 (io), 13 PB7 (io), 14 GND (power), 15 VCC (power), 16 PC0 (io), 17 PC1 (io), 18 PC2 (io), 19 PC3 (io), 20 PC4 (io), 21 PC5 (io), 22 PC6 (io), 23 PC7 (io), 24 GND hidden, 25 VCC hidden, 26 PD0 (io), 27 PD1 (io), 28 PD2 (io), 29 PD3 (io), 30 PD4 (io), 31 PD5 (io), 32 PD6 (io), 33 PD7 (io), 34 GND hidden, 35 VCC hidden, 36 PE0 (io), 37 PE1 (io), 38 PE2 (io), 39 PE3 (io), 40 PE4 (io), 41 PE5 (io), 42 PE6 (io), 43 PE7 (io), 44 GND hidden, 45 VCC hidden, 46 PF0 (io), 47 PF1 (io), 48 PF2 (io), 49 PF3 (io), 50 PF4 (io), 51 PF5 (io), 52 GND hidden, 53 VCC hidden, 54 PF6 (io), 55 PF7 (io), 56 PDI_DATA (io), 57 ~{{RESET}/PDI_CLK} (in), 58 PR0/XTAL2 (io), 59 PR1/XTAL1 (io), 60 GND hidden, 61 AVCC (power), 62 AREFA/PA0 (io), 63 PA1 (io), 64 PA2 (io), 65 GND hidden